# Altium footprint library custom.PcbLib: 317 footprints (part 13 of 20)
Each footprint in its own frame and in the unit in brackets; x right, y up, seen from the top. Pads: shape width x height; smd on the part's side, far side on the other; paste and mask are expansions set on the pad; w line width, h text height; cw(c..) or ccw(c..) is an arc to the next point about the centre after c.
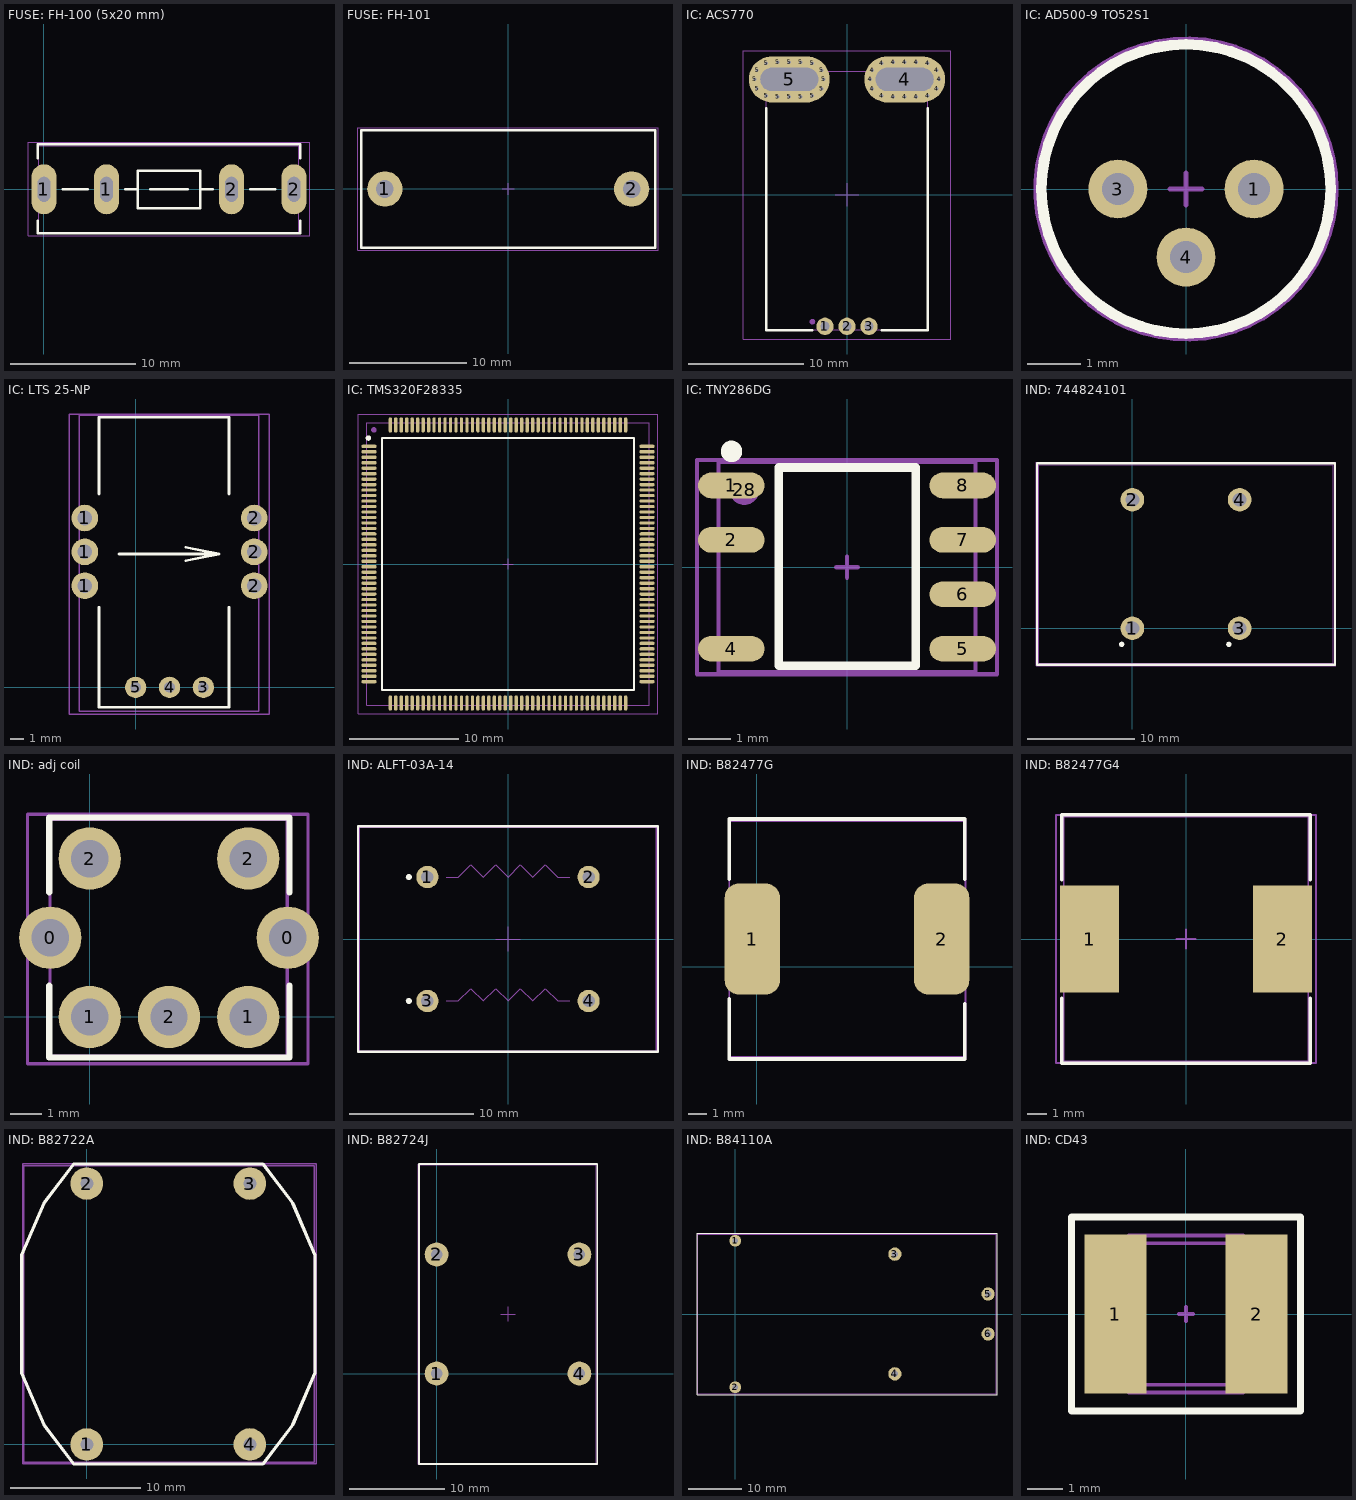
[diagram p12: the footprints below, top view; thin cyan lines are the x and y axes]

## FUSE: FH-100 (5x20 mm) [mm]
pads (4):
  oval 2x4 hole 2 slot 1 at 0 deg: 1(0,0) 1(5,0) 2(15,0) 2(20,0)
Top Overlay:
  lines w0.2: -0.5,-2.5 -0.5,-3.5 20.5,-3.5 20.5,-2.5 ; -0.5,2.5 -0.5,3.6 20.5,3.6 20.5,2.5 ; 1.5,0 3.5,0 ; 6.5,0 7.5,0 ; 8.5,0 11.5,0 ; 12.5,0 13.5,0 ; 16.5,0 18.5,0 ; 7.5,-1.5 7.5,1.5 12.5,1.5 12.5,-1.5 7.5,-1.5
Top Assy:
  lines w0.1: 1.5,0 3.5,0 ; 6.5,0 7.5,0 ; 12.5,0 13.5,0 ; 16.5,0 18.5,0 ; 7.5,0 7.5,1.5 12.5,1.5 12.5,-1.5 7.5,-1.5 7.5,0 ; -0.4,-3.5 -0.4,3.5 20.4,3.5 20.4,-3.5 -0.4,-3.5
Size Area:
  lines w0.1: -1.25,-3.7 -1.25,3.75 21.25,3.75 21.25,-3.7 -1.25,-3.7
3D body "User Library-Clips FH-100 with fuse 5x20.STEP": height 9.99, standoff -3.5, extent -0.4,-3.5 20.4,3.5

## FUSE: FH-101 [mm] "Fuse connector PCB mount"
height 12
pads (2):
  round 3 hole 1.5: 1(-10.5,0) 2(10.5,0)
Top Overlay:
  lines w0.2: -12.5,-5 12.5,-5 12.5,5 -12.5,5 -12.5,-5
Top Assy:
  lines w0.1: -12.5,-5 -12.5,5 12.5,5 12.5,-5 -12.5,-5
Size Area:
  lines w0.1: -0.5,0 0.5,0 ; 0,-0.5 0,0.5 ; -12.786,-5.207 12.741,-5.207 12.741,5.207 -12.786,5.207 -12.786,-5.207
3D body "����_��������������_FH-101.STEP": height 11, standoff -2, extent -12.024,-4.826 11.976,4.974

## IC: ACS770 [mm]
pads (38):
  round 1.5 hole 0.8: 1(-1.91,-11.4) 2(0,-11.4) 3(1.91,-11.4)
  round 0.5 on Mech1: 4(-3,-11)
  round 0.7 hole 0.3: 4(2,10) 4(2.2,9.2) 4(2.2,10.8) 4(3,8.6) 4(3,11.4) 4(4,8.5) 4(4,11.5) 4(5,8.5) 4(5,11.5) 4(6,8.5) 4(6,11.5) 4(7,8.6) 4(7,11.4) 4(7.8,9.2) 4(7.8,10.8) 4(8,10) 5(-8,10) 5(-7.8,9.2) 5(-7.8,10.8) 5(-7,8.6) 5(-7,11.4) 5(-6,8.5) 5(-6,11.5) 5(-5,8.5) 5(-5,11.5) 5(-4,8.5) 5(-4,11.5) 5(-3,8.6) 5(-3,11.4) 5(-2.2,9.2) 5(-2.2,10.8) 5(-2,10)
  oval 7x4 hole 2 slot 5 at 0 deg: 4(5,10) 5(-5,10)
Top Overlay:
  lines w0.2: -7,7.5 -7,-11.75 -3,-11.75 ; 3,-11.75 7,-11.75 7,7.5
Top Assy:
  lines w0.1: -7,-11.705 7,-11.705 7,10.705 -7,10.705 -7,-11.705
Size Area:
  lines w0.1: -1,0 1,0 ; 0,-1 0,1 ; -9,-12.5 9,-12.5 ; -9,-12.5 9,-12.5 ; -9,-12.5 -9,12.5 9,12.5 9,-12.5
3D body "User Library-ACS758xCB-PFF.STEP": height 7.5, standoff -2.98, extent -7,-11.705 7,10.705

## IC: AD500-9 TO52S1 [mm]
pads (3):
  round 1.1 hole 0.6: 1(1.27,0) 3(-1.27,0) 4(0,-1.27)
Top Overlay:
  circle w0.2: c0,0 r2.7
Top Assy:
  circle w0.1: c0,0 r2.7
Size Area:
  circle w0.1: c0,0 r2.8
  lines w0.1: -0.3,0 0.3,0 ; 0,-0.3 0,0.3

## IC: LTS 25-NP [mm]
pads (9):
  round 2 hole 1.1: 1(-3.81,7.62) 1(-3.81,10.16) 1(-3.81,12.7) 2(8.89,7.62) 2(8.89,10.16) 2(8.89,12.7)
  round 1.6 hole 0.8: 3(5.08,0) 4(2.54,0) 5(0,0)
Top Overlay:
  lines w0.2: -2.75,6 -2.75,-1.5 7,-1.5 7,6 ; -2.75,14.5 -2.75,20.25 7,20.25 7,14.5 ; -1.25,10 6.25,10 ; 3.75,9.5 6.25,10 ; 3.75,10.5 6.25,10
Top Assy:
  lines w0.1: -4.25,-1.8 9.25,-1.8 9.25,20.4 -4.25,20.4 -4.25,-1.8
Size Area:
  lines w0.1: -5,-2 10,-2 10,20.5 -5,20.5 -5,-2
3D body "User Library-LTS6_NP.STEP": height 24, standoff -3.5, extent -4.25,-1.8 9.25,20.4

## IC: TMS320F28335 [mm] "Thin QFP, 176-Leads, Body 24x24mm, Pitch 0.5mm, IPC Medium Density"
height 1.6
pads (178):
  oval 1.4x0.3 smd: 1(-12.7,10.75) 2(-12.7,10.25) 3(-12.7,9.75) 4(-12.7,9.25) 5(-12.7,8.75) 6(-12.7,8.25) 7(-12.7,7.75) 8(-12.7,7.25) 9(-12.7,6.75) 10(-12.7,6.25) 11(-12.7,5.75) 12(-12.7,5.25) 13(-12.7,4.75) 14(-12.7,4.25) 15(-12.7,3.75) 16(-12.7,3.25) 17(-12.7,2.75) 18(-12.7,2.25) 19(-12.7,1.75) 20(-12.7,1.25) 21(-12.7,0.75) 22(-12.7,0.25) 23(-12.7,-0.25) 24(-12.7,-0.75) 25(-12.7,-1.25) 26(-12.7,-1.75) 27(-12.7,-2.25) 28(-12.7,-2.75) 29(-12.7,-3.25) 30(-12.7,-3.75) 31(-12.7,-4.25) 32(-12.7,-4.75) 33(-12.7,-5.25) 34(-12.7,-5.75) 35(-12.7,-6.25) 36(-12.7,-6.75) 37(-12.7,-7.25) 38(-12.7,-7.75) 39(-12.7,-8.25) 40(-12.7,-8.75) 41(-12.7,-9.25) 42(-12.7,-9.75) 43(-12.7,-10.25) 44(-12.7,-10.75) 89(12.7,-10.75) 90(12.7,-10.25) 91(12.7,-9.75) 92(12.7,-9.25) 93(12.7,-8.75) 94(12.7,-8.25) 95(12.7,-7.75) 96(12.7,-7.25) 97(12.7,-6.75) 98(12.7,-6.25) 99(12.7,-5.75) 100(12.7,-5.25) 101(12.7,-4.75) 102(12.7,-4.25) 103(12.7,-3.75) 104(12.7,-3.25) 105(12.7,-2.75) 106(12.7,-2.25) 107(12.7,-1.75) 108(12.7,-1.25) 109(12.7,-0.75) 110(12.7,-0.25) 111(12.7,0.25) 112(12.7,0.75) 113(12.7,1.25) 114(12.7,1.75) 115(12.7,2.25) 116(12.7,2.75) 117(12.7,3.25) 118(12.7,3.75) 119(12.7,4.25) 120(12.7,4.75) 121(12.7,5.25) 122(12.7,5.75) 123(12.7,6.25) 124(12.7,6.75) 125(12.7,7.25) 126(12.7,7.75) 127(12.7,8.25) 128(12.7,8.75) 129(12.7,9.25) 130(12.7,9.75) 131(12.7,10.25) 132(12.7,10.75)
  round 0.5 on Top Overlay: 5(-12.75,11.5)
  round 0.5 on Mech1: 6(-12.25,12.25)
  oval 0.3x1.4 smd: 45(-10.75,-12.7) 46(-10.25,-12.7) 47(-9.75,-12.7) 48(-9.25,-12.7) 49(-8.75,-12.7) 50(-8.25,-12.7) 51(-7.75,-12.7) 52(-7.25,-12.7) 53(-6.75,-12.7) 54(-6.25,-12.7) 55(-5.75,-12.7) 56(-5.25,-12.7) 57(-4.75,-12.7) 58(-4.25,-12.7) 59(-3.75,-12.7) 60(-3.25,-12.7) 61(-2.75,-12.7) 62(-2.25,-12.7) 63(-1.75,-12.7) 64(-1.25,-12.7) 65(-0.75,-12.7) 66(-0.25,-12.7) 67(0.25,-12.7) 68(0.75,-12.7) 69(1.25,-12.7) 70(1.75,-12.7) 71(2.25,-12.7) 72(2.75,-12.7) 73(3.25,-12.7) 74(3.75,-12.7) 75(4.25,-12.7) 76(4.75,-12.7) 77(5.25,-12.7) 78(5.75,-12.7) 79(6.25,-12.7) 80(6.75,-12.7) 81(7.25,-12.7) 82(7.75,-12.7) 83(8.25,-12.7) 84(8.75,-12.7) 85(9.25,-12.7) 86(9.75,-12.7) 87(10.25,-12.7) 88(10.75,-12.7) 133(10.75,12.7) 134(10.25,12.7) 135(9.75,12.7) 136(9.25,12.7) 137(8.75,12.7) 138(8.25,12.7) 139(7.75,12.7) 140(7.25,12.7) 141(6.75,12.7) 142(6.25,12.7) 143(5.75,12.7) 144(5.25,12.7) 145(4.75,12.7) 146(4.25,12.7) 147(3.75,12.7) 148(3.25,12.7) 149(2.75,12.7) 150(2.25,12.7) 151(1.75,12.7) 152(1.25,12.7) 153(0.75,12.7) 154(0.25,12.7) 155(-0.25,12.7) 156(-0.75,12.7) 157(-1.25,12.7) 158(-1.75,12.7) 159(-2.25,12.7) 160(-2.75,12.7) 161(-3.25,12.7) 162(-3.75,12.7) 163(-4.25,12.7) 164(-4.75,12.7) 165(-5.25,12.7) 166(-5.75,12.7) 167(-6.25,12.7) 168(-6.75,12.7) 169(-7.25,12.7) 170(-7.75,12.7) 171(-8.25,12.7) 172(-8.75,12.7) 173(-9.25,12.7) 174(-9.75,12.7) 175(-10.25,12.7) 176(-10.75,12.7)
Top Overlay:
  lines w0.2: -11.5,-11.5 11.5,-11.5 11.5,11.5 -11.5,11.5 -11.5,-11.5
Top Assy:
  lines w0.1: -12.886,-12.886 12.886,-12.886 12.886,12.886 -12.886,12.886 -12.886,-12.886
Size Area:
  lines w0.1: -0.5,0 0.5,0 ; 0,-0.5 0,0.5 ; -13.7,-13.7 13.7,-13.7 13.7,13.7 -13.7,13.7 -13.7,-13.7
3D body "User Library-LQFP176-0_5_.STEP": height 1.62, standoff 0.03, extent -12.886,-12.886 12.886,12.886

## IC: TNY286DG [mm]
pads (8):
  rrect100% 1.55x0.6 smd: 1(-2.7,1.905) 2(-2.7,0.635) 4(-2.7,-1.905) 5(2.7,-1.905) 6(2.7,-0.635) 7(2.7,0.635) 8(2.7,1.905)
  round 0.7 on Mech1: 28(-2.395,1.8)
Top Overlay:
  circle w0.25: c-2.695,2.7 r0.125
  lines w0.2: -1.595,-2.3 1.605,-2.3 1.605,2.325 -1.595,2.325 -1.595,-2.3
Top Assy:
  lines w0.1: -3,-2.45 -3,2.45 3,2.45 3,-2.45 -3,-2.45
Size Area:
  lines w0.1: -0.25,0 0.25,0 ; 0,-0.25 0,0.25 ; -3.5,-2.5 -3.5,2.5 3.5,2.5 3.5,-2.5 -3.5,-2.5
3D body "User Library-SOIC-7.STEP": height 1.75, standoff 0, extent -3,-2.45 3,2.45

## IND: 744824101 [mm]
pads (6):
  round 2.2 hole 1.3: 1(0,0) 2(0,12) 3(10,0) 4(10,12)
  round 0.5 on Top Overlay: ""(-1,-1.5) ""(9,-1.5)
Top Overlay:
  lines w0.2: -8.9,-3.4 -8.9,15.4 18.9,15.4 18.9,-3.4 -8.9,-3.4
Top Assy:
  lines w0.1: -8.75,-3.25 18.75,-3.25 18.75,15.25 -8.75,15.25 -8.75,-3.25
Size Area:
  lines w0.1: -9,-3.5 -9,15.5 19,15.5 19,-3.5 -9,-3.5
3D body "STEP-WE-CMB-L-rev1.stp": height 31.8, standoff -6.2, extent -8.75,-3.25 18.75,15.25

## IND: adj coil [mm]
pads (7):
  round 2 hole 1.2: 0(-1.27,2.54) 0(6.35,2.54) 1(0,0) 1(5.08,0) 2(0,5.08) 2(2.54,0) 2(5.08,5.08)
Top Overlay:
  lines w0.2: -1.3,1 -1.3,-1.3 6.4,-1.3 6.4,1 ; -1.3,4 -1.3,6.4 6.4,6.4 6.4,4
Top Assy:
  lines w0.1: -1.27,-1.26 6.33,-1.26 6.33,6.34 -1.27,6.34 -1.27,-1.26
Size Area:
  lines w0.1: -2,-1.5 -2,6.5 7,6.5 7,-1.5 -2,-1.5
3D body "User Library-Coils_150_SL.STEP": height 12.1, standoff -3.51, extent -1.27,-1.26 6.33,6.34

## IND: ALFT-03A-14 [mm]
pads (6):
  round 1.8 hole 1: 1(-6.5,5) 2(6.5,5) 3(-6.5,-5) 4(6.5,-5)
  round 0.5 on Top Overlay: ""(-8,-5) ""(-8,5)
Top Overlay:
  lines w0.2: -12.1,-9.1 12.1,-9.1 12.1,-7.9 12.1,9.1 10.8,9.1 -12,9.1 -12.1,9.1 -12.1,-9.1
3D model:
  lines w0.1: -5,-5 -4,-5 -3,-4 -2,-5 -1,-4 0,-5 1,-4 2,-5 3,-4 4,-5 5,-5 ; -5,5 -4,5 -3,6 -2,5 -1,6 0,5 1,6 2,5 3,6 4,5 5,5 ; -11.95,-9 -11.95,9 11.95,9 11.95,-9 -11.95,-9
Size Area:
  lines w0.1: -1,0 1,0 ; 0,-1 0,1 ; -12,-9 -12,9 12,9 12,-9 -12,-9
3D body "ALFT-03A.STEP": height 21.72, standoff -3.17, extent -11.95,-9 11.95,9

## IND: B82477G [mm]
pads (2):
  rrect50% 3x6 smd: 1(-0.25,1.5) 2(10,1.5)
Top Overlay:
  lines w0.2: -1.5,-1.75 -1.5,-5 11.25,-5 11.25,-2 ; -1.5,4.75 -1.5,8 11.25,8 11.25,4.75
Top Assy:
  lines w0.1: -1.5,-4.9 -1.5,7.9 11.3,7.9 11.3,-4.9 -1.5,-4.9
Size Area:
  lines w0.1: -1.5,-5 -1.5,8 11.2,8 11.3,8 11.3,4 11.3,-5 -1.5,-5
3D body "User Library-b82477g4.STEP": height 8, standoff 0, extent -1.5,-4.9 11.3,7.9

## IND: B82477G4 [mm]
pads (2):
  rect 3.1x5.6 smd: 1(-5.05,0) 2(5.05,0)
Top Overlay:
  lines w0.2: -6.5,-3.1 -6.5,-6.5 6.5,-6.5 6.5,-3.1 ; -6.5,3.1 -6.5,6.5 6.5,6.5 6.5,3.1
Top Assy:
  lines w0.1: 6.4,-6.4 6.4,6.4 ; 6.4,-6.4 6.4,-6.4 ; 6.4,-6.4 -6.4,-6.4 -6.4,6.4 6.4,6.4 ; 6.4,6.4 6.4,6.4
Size Area:
  lines w0.1: -0.5,0 0.5,0 ; 0,-0.5 0,0.5 ; -6.8,-6.5 -6.8,6.5 6.8,6.5 6.8,-6.5 -6.8,-6.5
3D body "User Library-b82477g4.STEP": height 8, standoff 0, extent -6.4,-6.4 6.4,6.4

## IND: B82722A [mm]
pads (4):
  round 2.5 hole 1: 1(0,0) 2(0,20) 3(12.5,20) 4(12.5,0)
Top Overlay:
  lines w0.254: -5,5.5 -3.286,1.5 -1,-1.5 13.5,-1.5 15.786,1.5 17.5,5.5 17.5,14.5 15.786,18.5 13.5,21.5 -1,21.5 -3.286,18.5 -5,14.5 -5,5.5
Top Assy:
  lines w0.1: -4.85,-1.35 17.45,-1.35 17.45,21.35 -4.85,21.35 -4.85,-1.35
Size Area:
  lines w0.1: -4.9,-1.5 17.6,-1.5 17.6,21.5 -4.9,21.5 -4.9,-1.5
3D body "User Library-B82722A.STEP": height 13.31, standoff -3.2, extent -4.85,-1.35 17.45,21.35

## IND: B82724J [mm]
pads (4):
  round 2.5 hole 1.2: 1(0,0) 2(0,12.5) 3(15,12.5) 4(15,0)
Top Overlay:
  lines w0.2: -1.85,-9.5 16.875,-9.5 16.875,22 -1.85,22 -1.85,-9.5
Top Assy:
  lines w0.1: -1.75,-9.4 16.75,-9.4 16.75,21.9 -1.75,21.9 -1.75,-9.4
Size Area:
  lines w0.1: 6.75,6.25 8.25,6.25 ; 7.5,5.5 7.5,7 ; -1.9,-9.5 16.9,-9.5 16.9,22 -1.9,22 -1.9,-9.5
3D body "User Library-B82724J.STEP": height 33.21, standoff -4, extent -1.75,-9.4 16.75,21.9

## IND: B84110A [mm]
pads (6):
  round 2.2 hole 1.1: 1(0,13.75) 2(0,-13.75)
  round 2.5 hole 1.2: 3(30,11.25) 4(30,-11.25) 5(47.5,3.75) 6(47.5,-3.75)
Top Overlay:
  lines w0.2: -7.175,-15.175 49.175,-15.175 49.175,15.175 -7.175,15.175 -7.175,-15.175
Top Assy:
  lines w0.1: 49,15 -7,15 -7,-15 49,-15 49,15 ; 49,15 49,15
Size Area:
  lines w0.1: -7,-15 -7,15 49,15 49,-15 -7,-15
3D body "B84110A.stp": height 23.1, standoff -4, extent -7,-15 49,15

## IND: CD43 [mm]
height 3.2
pads (2):
  rect 1.75x4.5 smd: 1(-2,0) 2(2,0)
Top Overlay:
  lines w0.2: -3.25,-2.75 -3.25,2.75 3.25,2.75 3.25,-2.75 -3.25,-2.75
Top Assy:
  lines w0.1: -1.5,-2 cw(c0,0) -1.5,2 1.5,2 cw(c0,0) 1.5,-2 -1.5,-2
Size Area:
  lines w0.1: -0.2,0 0.2,0 ; 0,-0.2 0,0.2 ; -1.617,-2.224 cw(c0,0) -1.617,2.224 1.617,2.224 cw(c0,0) 1.617,-2.224 -1.617,-2.224
3D body "CD43.STEP": height 3.2, standoff 0, extent -2.244,-2 2.244,2